# Altium footprint library Reflow3D1411sep.PcbLib: 657 footprints (part 21 of 42)
Each footprint in its own frame and in the unit in brackets; x right, y up, seen from the top. Pads: shape width x height; smd on the part's side, far side on the other; paste and mask are expansions set on the pad; w line width, h text height; cw(c..) or ccw(c..) is an arc to the next point about the centre after c.
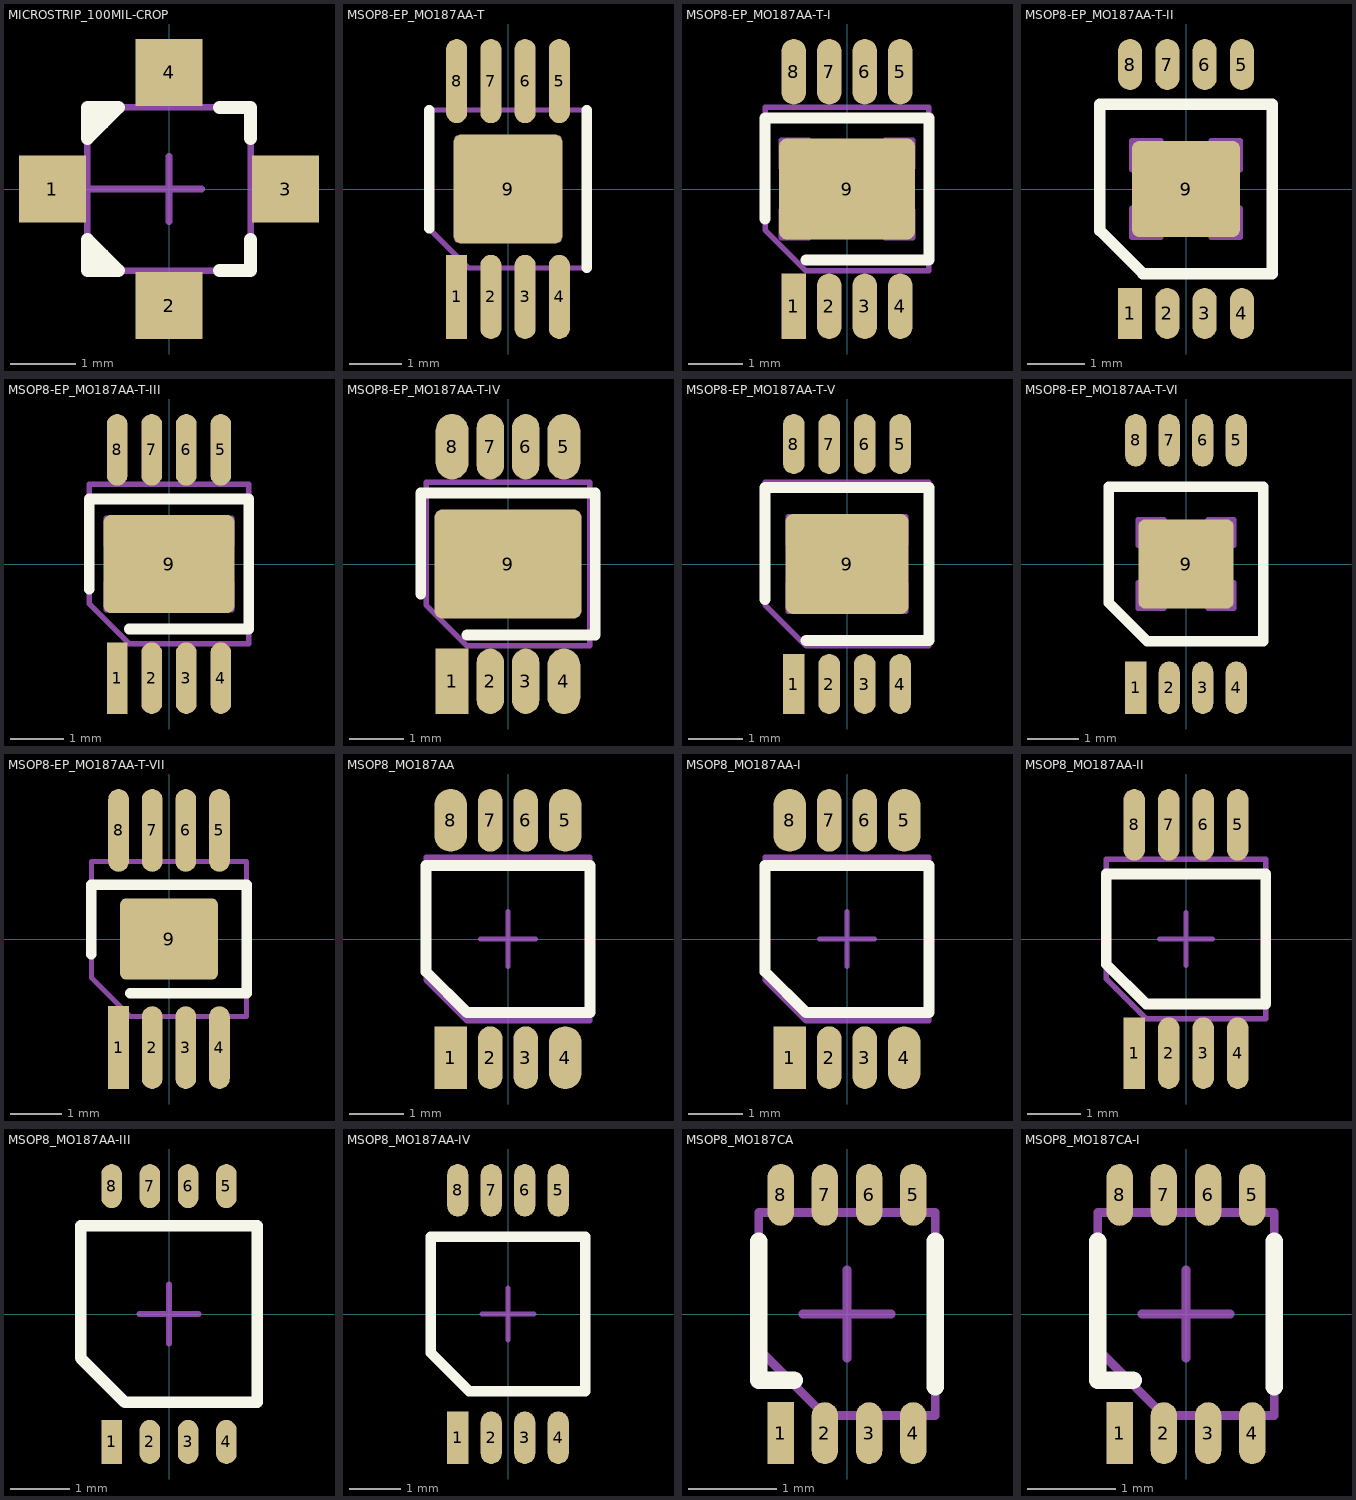
[diagram p20: the footprints below, top view; thin cyan lines are the x and y axes]

## MICROSTRIP_100MIL-CROP [mm] "www.aeroflex.com, H40.pdf; www.agilent.com, layout.pdf, HPAC100"
height 1.03
pads (4):
  rect 1.02x1.02 smd: 1(-1.78,0) 2(0,-1.78) 3(1.78,0) 4(0,1.78)
Top Overlay:
  lines w0.2: -1.01,-1.01 -1.245,-1.245 ; -1.01,1.01 -1.245,1.245 ; 0.775,-1.245 1.245,-1.245 1.245,-0.775 ; 0.775,1.245 1.245,1.245 1.245,0.775 ; -1.245,-1.245 -1.245,-0.775 -0.775,-1.245 -1.245,-1.245 ; -1.245,1.245 -1.245,0.775 -0.775,1.245 -1.245,1.245
Mechanical 13:
  lines w0.1: -1.245,0 -0.495,0 ; -1.245,-1.245 1.245,-1.245 1.245,1.245 -1.245,1.245 -1.245,-1.245
Mechanical 15:
  lines w0.1: -0.5,0 0.5,0 ; 0,-0.5 0,0.5
3D body: height 1.25, standoff 0, extent -1.32,-1.32 1.32,1.32

## MSOP8-EP_MO187AA-T [mm] "www.semtech.com, sc4501.pdf; www.jedec.org, mo-187e.pdf"
height 0.93
pads (9):
  rect 0.4x1.6 smd mask+0.05: 1(-0.975,-2.05)
  oval 0.4x1.6 smd mask+0.05: 2(-0.325,-2.05) 3(0.325,-2.05) 4(0.975,-2.05) 5(0.975,2.05) 6(0.325,2.05) 7(-0.325,2.05) 8(-0.975,2.05)
  rrect15% 2.08x2.08 smd mask+0.05: 9(0,0)
Top Overlay:
  lines w0.2: -1.5,-0.75 -1.5,1.5 ; 1.5,-1.5 1.5,1.5
Mechanical 13:
  lines w0.1: -0.965,-0.465 -0.965,-0.965 -0.465,-0.965 ; -0.965,0.465 -0.965,0.965 -0.465,0.965 ; 0.465,-0.965 0.965,-0.965 0.965,-0.465 ; 0.465,0.965 0.965,0.965 0.965,0.465 ; -1.5,-0.75 -1.5,1.5 1.5,1.5 1.5,-1.5 -0.75,-1.5 -1.5,-0.75
Mechanical 15:
  lines w0.1: -0.5,0 0.5,0 ; 0,-0.5 0,0.5
3D body: height 1.1, standoff 0, extent -1.55,-1.55 1.55,1.55

## MSOP8-EP_MO187AA-T-I [mm] "www.hittite.com, ms8_ms8g_package_info.pdf; www.jedec.org, mo-187e.pdf"
height 0.93
pads (9):
  rect 0.45x1.2 smd mask+0.05: 1(-0.975,-2.15)
  oval 0.45x1.2 smd mask+0.05: 2(-0.325,-2.15) 3(0.325,-2.15) 4(0.975,-2.15) 5(0.975,2.15) 6(0.325,2.15) 7(-0.325,2.15) 8(-0.975,2.15)
  rrect15% 2.49x1.85 smd mask+0.075: 9(0,0)
Top Overlay:
  lines w0.2: -1.5,-0.55 -1.5,1.3 1.5,1.3 1.5,-1.3 -0.75,-1.3
Mechanical 13:
  lines w0.1: -1.205,-0.39 -1.205,-0.89 -0.705,-0.89 ; -1.205,0.39 -1.205,0.89 -0.705,0.89 ; 0.705,-0.89 1.205,-0.89 1.205,-0.39 ; 0.705,0.89 1.205,0.89 1.205,0.39 ; -1.5,-0.75 -0.75,-1.5 1.5,-1.5 1.5,1.5 -1.5,1.5 -1.5,-0.75
Mechanical 15:
  lines w0.1: -0.5,0 0.5,0 ; 0,-0.5 0,0.5
3D body: height 1.1, standoff 0, extent -1.55,-1.55 1.55,1.55

## MSOP8-EP_MO187AA-T-II [mm] "www.linear.com, MSOP_8_05-08-1662.pdf"
height 0.96
pads (9):
  rect 0.42x0.89 smd mask+0.05: 1(-0.975,-2.17)
  oval 0.42x0.89 smd mask+0.05: 2(-0.325,-2.17) 3(0.325,-2.17) 4(0.975,-2.17) 5(0.975,2.17) 6(0.325,2.17) 7(-0.325,2.17) 8(-0.975,2.17)
  rrect15% 1.88x1.68 smd mask+0.075: 9(0,0)
Top Overlay:
  lines w0.2: -1.5,-0.725 -0.75,-1.475 1.5,-1.475 1.5,1.475 -1.5,1.475 -1.5,-0.725
Mechanical 13:
  lines w0.1: -0.94,-0.34 -0.94,-0.84 -0.44,-0.84 ; -0.94,0.34 -0.94,0.84 -0.44,0.84 ; 0.44,-0.84 0.94,-0.84 0.94,-0.34 ; 0.44,0.84 0.94,0.84 0.94,0.34 ; -1.5,-0.75 -1.5,1.5 1.5,1.5 1.5,-1.5 -0.75,-1.5 -1.5,-0.75
Mechanical 15:
  lines w0.1: -0.5,0 0.5,0 ; 0,-0.5 0,0.5
3D body: height 1.1, standoff 0, extent -1.55,-1.55 1.55,1.55

## MSOP8-EP_MO187AA-T-III [mm] "www.maxim-ic.com, 21-0107.PDF, 90-0145.PDF"
height 0.93
pads (9):
  rect 0.39x1.35 smd mask+0.05: 1(-0.975,-2.15)
  oval 0.39x1.35 smd mask+0.05: 2(-0.325,-2.15) 3(0.325,-2.15) 4(0.975,-2.15) 5(0.975,2.15) 6(0.325,2.15) 7(-0.325,2.15) 8(-0.975,2.15)
  rrect15% 2.47x1.85 smd mask+0.075: 9(0,0)
Top Overlay:
  lines w0.2: -1.5,-0.475 -1.5,1.225 1.5,1.225 1.5,-1.225 -0.75,-1.225
Mechanical 13:
  lines w0.1: -1.185,-0.365 -1.185,-0.865 -0.685,-0.865 ; -1.185,0.365 -1.185,0.865 -0.685,0.865 ; 0.685,-0.865 1.185,-0.865 1.185,-0.365 ; 0.685,0.865 1.185,0.865 1.185,0.365 ; -1.5,-0.75 -0.75,-1.5 1.5,-1.5 1.5,1.5 -1.5,1.5 -1.5,-0.75
Mechanical 15:
  lines w0.1: -0.5,0 0.5,0 ; 0,-0.5 0,0.5
3D body: height 1.1, standoff 0, extent -1.525,-1.525 1.525,1.525

## MSOP8-EP_MO187AA-T-IV [mm] "www.nxp.com, sot770-1_po.pdf, SOT770-1_fr.pdf"
height 0.95
pads (9):
  rect 0.6x1.2 smd mask+0.085: 1(-1.025,-2.15)
  oval 0.5x1.2 smd mask+0.085: 2(-0.325,-2.15) 3(0.325,-2.15) 6(0.325,2.15) 7(-0.325,2.15)
  oval 0.6x1.2 smd mask+0.085: 4(1.025,-2.15) 5(1.025,2.15) 8(-1.025,2.15)
  rrect15% 2.7x2 smd paste-25.4 mask+0.075: 9(0,0)
Top Overlay:
  lines w0.2: -1.6,-0.55 -1.6,1.3 1.6,1.3 1.6,-1.3 -0.75,-1.3
Top Paste:
  region: 1.3,0.25 1.3,0.95 0.4,0.95 0.4,0.25
  region: -1.3,-0.25 -1.3,-0.95 -0.4,-0.95 -0.4,-0.25
  region: -0.4,0.25 -0.4,0.95 -1.3,0.95 -1.3,0.25
  region: 0.4,-0.25 0.4,-0.95 1.3,-0.95 1.3,-0.25
Mechanical 13:
  lines w0.1: -1.2,-0.365 -1.2,-0.865 -0.7,-0.865 ; -1.2,0.365 -1.2,0.865 -0.7,0.865 ; 0.7,-0.865 1.2,-0.865 1.2,-0.365 ; 0.7,0.865 1.2,0.865 1.2,0.365 ; -1.5,-0.75 -1.5,1.5 1.5,1.5 1.5,-1.5 -0.75,-1.5 -1.5,-0.75
Mechanical 15:
  lines w0.1: -0.5,0 0.5,0 ; 0,-0.5 0,0.5
3D body: height 1.1, standoff 0, extent -1.55,-1.55 1.55,1.55

## MSOP8-EP_MO187AA-T-V [mm] "www.analog.com, RH_8_1.pdf, RH-8-1.pdf, (RH-10-1.pdf)"
height 0.96
pads (9):
  rect 0.4x1.1 smd mask+0.05: 1(-0.975,-2.2)
  oval 0.4x1.1 smd mask+0.05: 2(-0.325,-2.2) 3(0.325,-2.2) 4(0.975,-2.2) 5(0.975,2.2) 6(0.325,2.2) 7(-0.325,2.2) 8(-0.975,2.2)
  rrect15% 2.26x1.83 smd mask+0.075: 9(0,0)
Top Overlay:
  lines w0.2: -1.5,-0.65 -1.5,1.4 1.5,1.4 1.5,-1.4 -0.75,-1.4
Mechanical 13:
  lines w0.1: -1.08,-0.365 -1.08,-0.865 -0.58,-0.865 ; -1.08,0.365 -1.08,0.865 -0.58,0.865 ; 0.58,-0.865 1.08,-0.865 1.08,-0.365 ; 0.58,0.865 1.08,0.865 1.08,0.365 ; -1.5,-0.75 -1.5,1.5 1.5,1.5 1.5,-1.5 -0.75,-1.5 -1.5,-0.75
Mechanical 15:
  lines w0.1: -0.5,0 0.5,0 ; 0,-0.5 0,0.5
3D body: height 1.1, standoff 0, extent -1.55,-1.55 1.55,1.55

## MSOP8-EP_MO187AA-T-VI [mm] "www.national.com, muy08a.pdf"
height 0.97
pads (9):
  rect 0.41x1.02 smd mask+0.05: 1(-0.975,-2.4)
  oval 0.41x1.02 smd mask+0.05: 2(-0.325,-2.4) 3(0.325,-2.4) 4(0.975,-2.4) 5(0.975,2.4) 6(0.325,2.4) 7(-0.325,2.4) 8(-0.975,2.4)
  rrect15% 1.85x1.73 smd mask+0.075: 9(0,0)
Top Overlay:
  lines w0.2: -1.5,-0.75 -1.5,1.5 1.5,1.5 1.5,-1.5 -0.75,-1.5 -1.5,-0.75
Mechanical 13:
  lines w0.1: -0.925,-0.365 -0.925,-0.865 -0.425,-0.865 ; -0.925,0.365 -0.925,0.865 -0.425,0.865 ; 0.425,-0.865 0.925,-0.865 0.925,-0.365 ; 0.425,0.865 0.925,0.865 0.925,0.365 ; -1.5,-0.75 -1.5,1.5 1.5,1.5 1.5,-1.5 -0.75,-1.5 -1.5,-0.75
Mechanical 15:
  lines w0.1: -0.5,0 0.5,0 ; 0,-0.5 0,0.5
3D body: height 1.09, standoff 0, extent -1.55,-1.55 1.55,1.55

## MSOP8-EP_MO187AA-T-VII [mm] "www.ti.com, tlv2474.pdf"
height 0.95
pads (9):
  rect 0.4x1.6 smd mask+0.05: 1(-0.975,-2.1)
  oval 0.4x1.6 smd mask+0.05: 2(-0.325,-2.1) 3(0.325,-2.1) 4(0.975,-2.1) 5(0.975,2.1) 6(0.325,2.1) 7(-0.325,2.1) 8(-0.975,2.1)
  rrect15% 1.89x1.57 smd mask+0.075: 9(0,0)
Top Overlay:
  lines w0.2: -1.5,-0.3 -1.5,1.05 1.5,1.05 1.5,-1.05 -0.75,-1.05
Mechanical 13:
  lines w0.1: -0.88,-0.215 -0.88,-0.715 -0.38,-0.715 ; -0.88,0.215 -0.88,0.715 -0.38,0.715 ; 0.38,-0.715 0.88,-0.715 0.88,-0.215 ; 0.38,0.715 0.88,0.715 0.88,0.215 ; -1.5,-0.75 -1.5,1.5 1.5,1.5 1.5,-1.5 -0.75,-1.5 -1.5,-0.75
Mechanical 15:
  lines w0.1: -0.5,0 0.5,0 ; 0,-0.5 0,0.5
3D body: height 1.1, standoff 0, extent -1.55,-1.55 1.55,1.55

## MSOP8_MO187AA [mm] "www.nxp.com, sot505-1_po.pdf, sot505-1_fr.pdf"
height 0.98
pads (8):
  rect 0.6x1.15 smd mask+0.05: 1(-1.05,-2.175)
  oval 0.45x1.15 smd mask+0.05: 2(-0.325,-2.175) 3(0.325,-2.175) 6(0.325,2.175) 7(-0.325,2.175)
  oval 0.6x1.15 smd mask+0.05: 4(1.05,-2.175) 5(1.05,2.175) 8(-1.05,2.175)
Top Overlay:
  lines w0.2: -1.5,-0.6 -0.75,-1.35 1.5,-1.35 1.5,1.35 -1.5,1.35 -1.5,-0.6
Mechanical 13:
  lines w0.1: -1.5,-0.75 -0.75,-1.5 1.5,-1.5 1.5,1.5 -1.5,1.5 -1.5,-0.75
Mechanical 15:
  lines w0.1: -0.5,0 0.5,0 ; 0,-0.5 0,0.5
3D body: height 1.1, standoff 0, extent -1.55,-1.55 1.55,1.55

## MSOP8_MO187AA-I [mm] "www.nxp.com, sot505-1_fr.pdf; www.analog.com, RM_8.pdf; www.jedec.org, mo-187e.pdf"
height 0.93
pads (8):
  rect 0.6x1.15 smd mask+0.05: 1(-1.05,-2.175)
  oval 0.45x1.15 smd mask+0.05: 2(-0.325,-2.175) 3(0.325,-2.175) 6(0.325,2.175) 7(-0.325,2.175)
  oval 0.6x1.15 smd mask+0.05: 4(1.05,-2.175) 5(1.05,2.175) 8(-1.05,2.175)
Top Overlay:
  lines w0.2: -1.5,-0.6 -0.75,-1.35 1.5,-1.35 1.5,1.35 -1.5,1.35 -1.5,-0.6
Mechanical 13:
  lines w0.1: -1.5,-0.75 -0.75,-1.5 1.5,-1.5 1.5,1.5 -1.5,1.5 -1.5,-0.75
Mechanical 15:
  lines w0.1: -0.5,0 0.5,0 ; 0,-0.5 0,0.5
3D body: height 1.1, standoff 0, extent -1.55,-1.55 1.55,1.55

## MSOP8_MO187AA-II [mm] "www.maxim-ic.com, 21-0036.PDF, 90-0092.PDF"
height 0.95
pads (8):
  rect 0.4x1.35 smd mask+0.05: 1(-0.975,-2.15)
  oval 0.4x1.35 smd mask+0.05: 2(-0.325,-2.15) 3(0.325,-2.15) 4(0.975,-2.15) 5(0.975,2.15) 6(0.325,2.15) 7(-0.325,2.15) 8(-0.975,2.15)
Top Overlay:
  lines w0.2: -1.5,-0.475 -1.5,1.225 1.5,1.225 1.5,-1.225 -0.75,-1.225 -1.5,-0.475
Mechanical 13:
  lines w0.1: -1.5,-0.75 -0.75,-1.5 1.5,-1.5 1.5,1.5 -1.5,1.5 -1.5,-0.75
Mechanical 15:
  lines w0.1: -0.5,0 0.5,0 ; 0,-0.5 0,0.5
3D body: height 1.1, standoff 0, extent -1.55,-1.55 1.55,1.55

## MSOP8_MO187AA-III [mm] "www.aosmd.com, MSOP-8.pdf"
height 0.98
pads (8):
  rect 0.35x0.75 smd mask+0.075: 1(-0.975,-2.175)
  oval 0.35x0.75 smd mask+0.075: 2(-0.325,-2.175) 3(0.325,-2.175) 4(0.975,-2.175) 5(0.975,2.175) 6(0.325,2.175) 7(-0.325,2.175) 8(-0.975,2.175)
Top Overlay:
  lines w0.2: -1.5,-0.75 -0.75,-1.5 1.5,-1.5 1.5,1.5 -1.5,1.5 -1.5,-0.75
Mechanical 13:
  lines w0.1: -1.5,-0.75 -1.5,1.5 1.5,1.5 1.5,-1.5 -0.75,-1.5 -1.5,-0.75
Mechanical 15:
  lines w0.1: -0.5,0 0.5,0 ; 0,-0.5 0,0.5
3D body: height 1.1, standoff 0, extent -1.525,-1.525 1.525,1.525

## MSOP8_MO187AA-IV [mm] "www.national.com, mua08a.pdf"
height 0.97
pads (8):
  rect 0.41x1.02 smd mask+0.05: 1(-0.975,-2.4)
  oval 0.41x1.02 smd mask+0.05: 2(-0.325,-2.4) 3(0.325,-2.4) 4(0.975,-2.4) 5(0.975,2.4) 6(0.325,2.4) 7(-0.325,2.4) 8(-0.975,2.4)
Top Overlay:
  lines w0.2: -1.5,-0.75 -1.5,1.5 1.5,1.5 1.5,-1.5 -0.75,-1.5 -1.5,-0.75
Mechanical 13:
  lines w0.1: -1.5,-0.75 -0.75,-1.5 1.5,-1.5 1.5,1.5 -1.5,1.5 -1.5,-0.75
Mechanical 15:
  lines w0.1: -0.5,0 0.5,0 ; 0,-0.5 0,0.5
3D body: height 1.09, standoff 0, extent -1.55,-1.55 1.55,1.55

## MSOP8_MO187CA [mm] "www.fairchildsemi.com, MAB08A.pdf"
height 0.75
pads (8):
  rect 0.3x0.7 smd mask+0.05: 1(-0.75,-1.35)
  oval 0.3x0.7 smd mask+0.05: 2(-0.25,-1.35) 3(0.25,-1.35) 4(0.75,-1.35) 5(0.75,1.35) 6(0.25,1.35) 7(-0.25,1.35) 8(-0.75,1.35)
Top Overlay:
  lines w0.2: -1,0.825 -1,-0.75 -0.6,-0.75 ; 1,-0.825 1,0.825
Mechanical 13:
  lines w0.1: -1,-0.4 -0.25,-1.15 1,-1.15 1,1.15 -1,1.15 -1,-0.4
Mechanical 15:
  lines w0.1: -0.5,0 0.5,0 ; 0,-0.5 0,0.5
3D body: height 0.9, standoff 0, extent -1.05,-1.2 1.05,1.2

## MSOP8_MO187CA-I [mm] "www.fairchildsemi.com, MAB08A.pdf; www.jedec.org, mo-187e.pdf"
height 0.8
pads (8):
  rect 0.3x0.7 smd mask+0.05: 1(-0.75,-1.35)
  oval 0.3x0.7 smd mask+0.05: 2(-0.25,-1.35) 3(0.25,-1.35) 4(0.75,-1.35) 5(0.75,1.35) 6(0.25,1.35) 7(-0.25,1.35) 8(-0.75,1.35)
Top Overlay:
  lines w0.2: -1,0.825 -1,-0.75 -0.6,-0.75 ; 1,-0.825 1,0.825
Mechanical 13:
  lines w0.1: -1,-0.4 -1,1.15 1,1.15 1,-1.15 -0.25,-1.15 -1,-0.4
Mechanical 15:
  lines w0.1: -0.5,0 0.5,0 ; 0,-0.5 0,0.5
3D body: height 1, standoff 0, extent -1.05,-1.2 1.05,1.2